# Altium footprint library CPU.PcbLib: 56 footprints (part 3 of 4)
Each footprint in its own frame and in the unit in brackets; x right, y up, seen from the top. Pads: shape width x height; smd on the part's side, far side on the other; paste and mask are expansions set on the pad; w line width, h text height; cw(c..) or ccw(c..) is an arc to the next point about the centre after c.
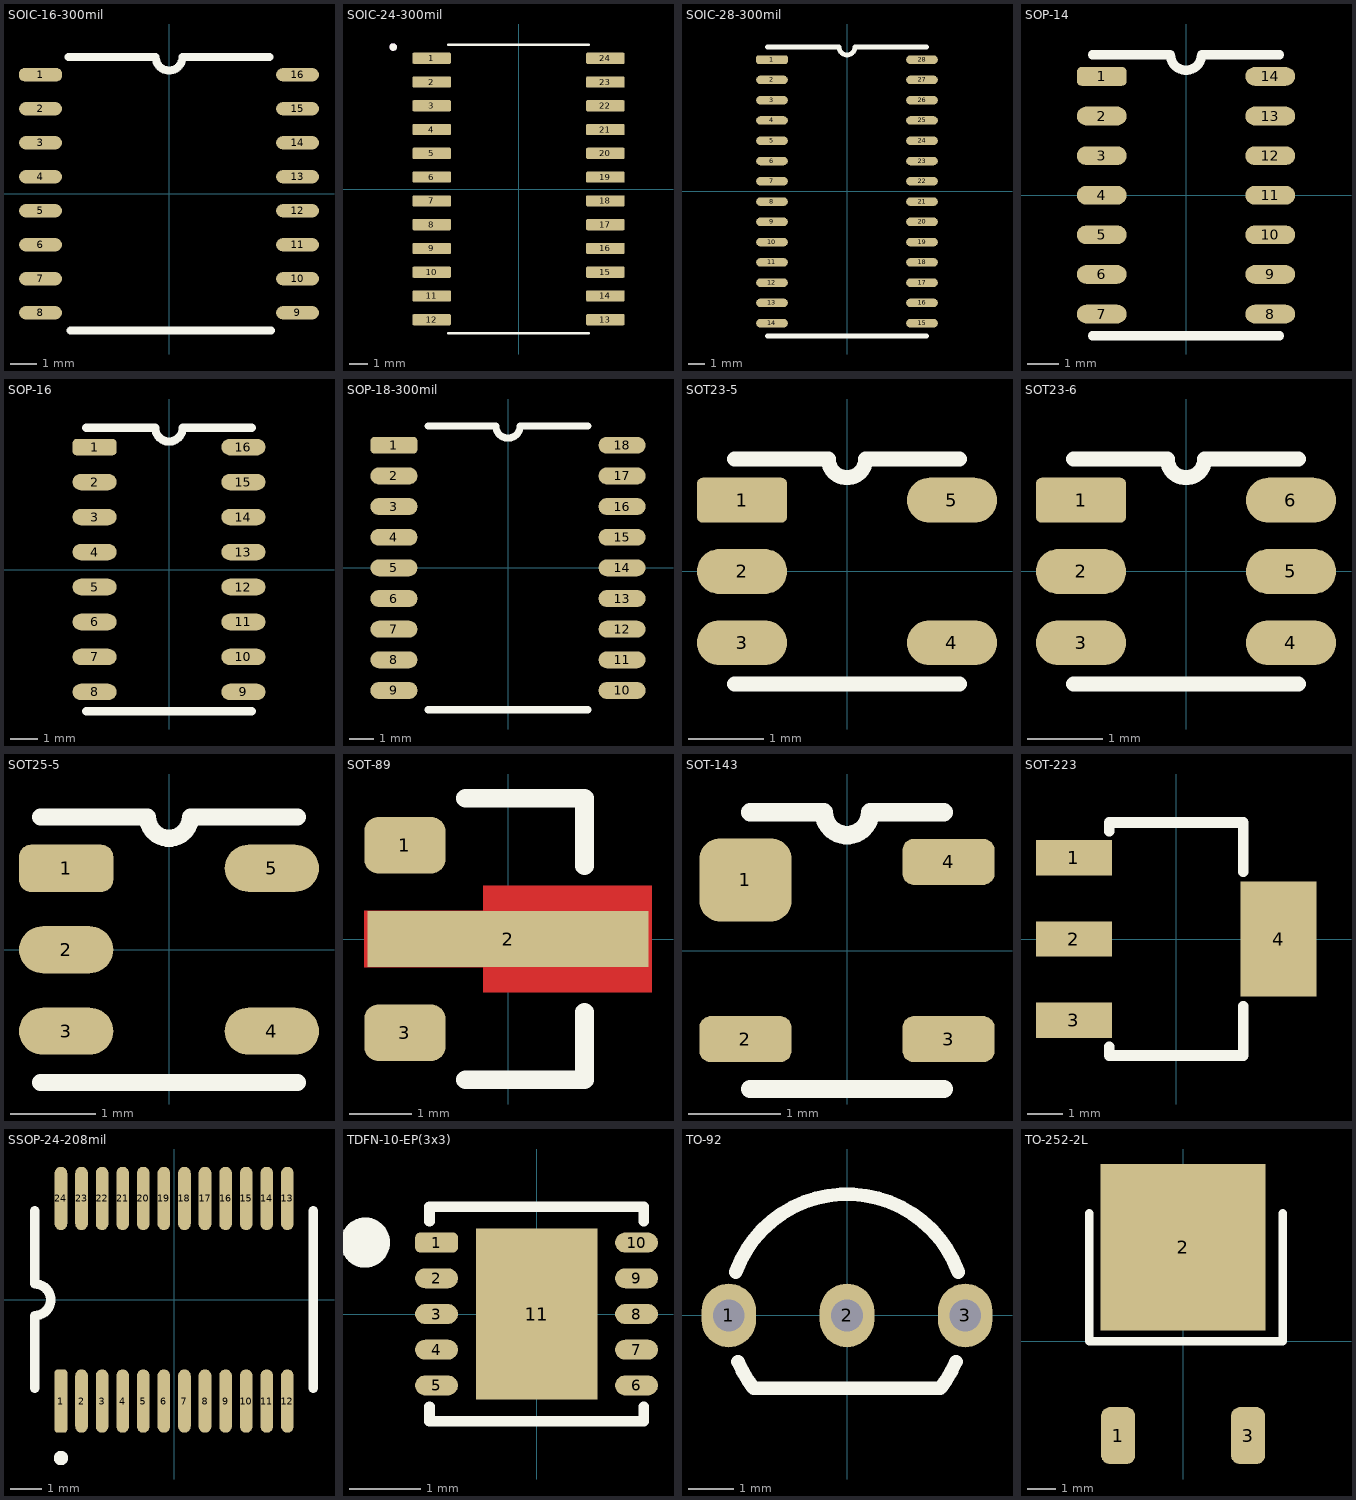
[diagram p2: the footprints below, top view; thin cyan lines are the x and y axes]

## SOIC-16-300mil [mm]
pads (16):
  rrect85% 1.61x0.5 smd: 1(-4.8,4.445)
  oval 1.6x0.5 smd: 2(-4.8,3.175) 3(-4.8,1.905) 4(-4.8,0.635) 5(-4.8,-0.635) 6(-4.8,-1.905) 7(-4.8,-3.175) 8(-4.8,-4.445) 9(4.8,-4.445) 10(4.8,-3.175) 11(4.8,-1.905) 12(4.8,-0.635) 13(4.8,0.635) 14(4.8,1.905) 15(4.8,3.175) 16(4.8,4.445)
Top Overlay:
  lines w0.3: -3.75,5.1 -0.5,5.1 ccw(c0,5.1) 0.5,5.1 3.75,5.1 ; -3.69,-5.1 3.81,-5.1
3D body "step_temp.STEP": height 2.65, standoff 0, extent -5.162,-5.15 5.162,5.15

## SOIC-24-300mil [mm]
pads (24):
  rrect25% 2.06x0.6 smd: 1(-4.64,6.985) 2(-4.64,5.715) 3(-4.64,4.445) 4(-4.64,3.175) 5(-4.64,1.905) 6(-4.64,0.635) 7(-4.64,-0.635) 8(-4.64,-1.905) 9(-4.64,-3.175) 10(-4.64,-4.445) 11(-4.64,-5.715) 12(-4.64,-6.985) 13(4.64,-6.985) 14(4.64,-5.715) 15(4.64,-4.445) 16(4.64,-3.175) 17(4.64,-1.905) 18(4.64,-0.635) 19(4.64,0.635) 20(4.64,1.905) 21(4.64,3.175) 22(4.64,4.445) 23(4.64,5.715) 24(4.64,6.985)
Top Overlay:
  circle w0.2: c-6.7,7.585 r0.1
  lines w0.127: -3.75,-7.7 3.75,-7.7 ; -3.75,7.7 3.75,7.7
3D:
  circle w0.2: c-6.7,7.585 r0.1

## SOIC-28-300mil [mil]
pads (28):
  rrect50% 78x21 smd: 1(-185,325)
  oval 78x21 smd: 2(-185,275) 3(-185,225) 4(-185,175) 5(-185,125) 6(-185,75) 7(-185,25) 8(-185,-25) 9(-185,-75) 10(-185,-125) 11(-185,-175) 12(-185,-225) 13(-185,-275) 14(-185,-325) 15(185,-325) 16(185,-275) 17(185,-225) 18(185,-175) 19(185,-125) 20(185,-75) 21(185,-25) 22(185,25) 23(185,75) 24(185,125) 25(185,175) 26(185,225) 27(185,275) 28(185,325)
Top Overlay:
  lines w11.81: -196.85,-356.3 196.85,-356.3 ; -196.85,356.3 -19.68,356.3 ccw(c0,356.3) 19.68,356.3 196.85,356.3
3D body "step_temp.STEP": height 104.33, standoff 0, extent -203.25,-352.36 203.25,352.36

## SOP-14 [mm]
pads (14):
  rrect50% 1.6x0.6 smd: 1(-2.7,3.81)
  oval 1.6x0.6 smd: 2(-2.7,2.54) 3(-2.7,1.27) 4(-2.7,0) 5(-2.7,-1.27) 6(-2.7,-2.54) 7(-2.7,-3.81) 8(2.7,-3.81) 9(2.7,-2.54) 10(2.7,-1.27) 11(2.7,0) 12(2.7,1.27) 13(2.7,2.54) 14(2.7,3.81)
Top Overlay:
  lines w0.3: -3,-4.51 3,-4.51 ; -3,4.51 -0.5,4.51 ccw(c0,4.51) 0.5,4.51 3,4.51
3D body "User Library-SOP14.STEP": height 1.39, standoff 0, extent -3.119,-4.375 3.119,4.375

## SOP-16 [mm]
pads (16):
  rrect50% 1.6x0.6 smd: 1(-2.7,4.445)
  oval 1.6x0.6 smd: 2(-2.7,3.175) 3(-2.7,1.905) 4(-2.7,0.635) 5(-2.7,-0.635) 6(-2.7,-1.905) 7(-2.7,-3.175) 8(-2.7,-4.445) 9(2.7,-4.445) 10(2.7,-3.175) 11(2.7,-1.905) 12(2.7,-0.635) 13(2.7,0.635) 14(2.7,1.905) 15(2.7,3.175) 16(2.7,4.445)
Top Overlay:
  lines w0.3: -3,-5.145 3,-5.145 ; -3,5.145 -0.5,5.145 ccw(c0,5.145) 0.5,5.145 3,5.145
3D body "pam8403dr.stp": height 1.63, standoff 0, extent -3.025,-5 3.025,4.9

## SOP-18-300mil [mm]
pads (18):
  rrect50% 1.95x0.7 smd: 1(-4.725,5.08)
  oval 1.95x0.7 smd: 2(-4.725,3.81) 3(-4.725,2.54) 4(-4.725,1.27) 5(-4.725,0) 6(-4.725,-1.27) 7(-4.725,-2.54) 8(-4.725,-3.81) 9(-4.725,-5.08) 10(4.725,-5.08) 11(4.725,-3.81) 12(4.725,-2.54) 13(4.725,-1.27) 14(4.725,0) 15(4.725,1.27) 16(4.725,2.54) 17(4.725,3.81) 18(4.725,5.08)
Top Overlay:
  lines w0.3: -3.3,-5.875 3.3,-5.875 ; -3.3,5.875 -0.5,5.875 ccw(c0,5.875) 0.5,5.875 3.3,5.875
3D body "DW0018A.stp": height 2.59, standoff 0, extent -5.167,-5.775 5.167,5.775

## SOT23-5 [mm]
pads (5):
  rrect25% 1.2x0.6 smd: 1(-1.4,0.95)
  oval 1.2x0.6 smd: 2(-1.4,0) 3(-1.4,-0.95) 4(1.4,-0.95) 5(1.4,0.95)
Top Overlay:
  lines w0.2: -1.5,-1.5 1.5,-1.5 ; -1.5,1.5 -0.25,1.5 ccw(c0,1.5) 0.25,1.5 1.5,1.5
3D body "step_temp.STEP": height 1.45, standoff 0, extent -1.4,-1.45 1.4,1.45

## SOT23-6 [mm]
pads (6):
  rrect25% 1.2x0.6 smd: 1(-1.4,0.95)
  oval 1.2x0.6 smd: 2(-1.4,0) 3(-1.4,-0.95) 4(1.4,-0.95) 5(1.4,0) 6(1.4,0.95)
Top Overlay:
  lines w0.2: -1.5,-1.5 1.5,-1.5 ; -1.5,1.5 -0.25,1.5 ccw(c0,1.5) 0.25,1.5 1.5,1.5
3D body "step_temp.STEP": height 1.45, standoff 0, extent -1.4,-1.45 1.4,1.45

## SOT25-5 [mm]
pads (5):
  rrect50% 1.1x0.55 smd: 1(-1.2,0.95)
  oval 1.1x0.55 smd: 2(-1.2,0) 3(-1.2,-0.95) 4(1.2,-0.95) 5(1.2,0.95)
Top Overlay:
  lines w0.2: -1.5,-1.55 1.5,-1.55 ; -1.5,1.55 -0.25,1.55 ccw(c0,1.55) 0.25,1.55 1.5,1.55
3D body "step_temp.STEP": height 1.4, standoff 0, extent -1.4,-1.5 1.4,1.5

## SOT-89 [mm]
height 1.6
pads (3):
  rrect50% 1.3x0.9 smd: 1(-1.65,1.5) 3(-1.65,-1.5)
  rect 4.5x0.9 smd paste-1 mask+0: 2(0,0)
Top Layer:
  region: 2.3,-0.85 -0.4,-0.85 -0.4,-0.45 -2.3,-0.45 -2.3,0.45 -0.4,0.45 -0.4,0.85 2.3,0.85
Top Overlay:
  lines w0.3: -0.68,-2.25 1.222,-2.25 1.222,-1.17 ; -0.68,2.25 1.222,2.25 1.222,1.17
Top Paste:
  region: 0.76,-0.47 -0.21,-0.47 -0.21,0.47 0.76,0.47
  region: 2.11,-0.47 1.14,-0.47 1.14,0.47 2.11,0.47
  region: -0.51,-0.235 -1.24,-0.235 -1.24,0.235 -0.51,0.235
  region: -1.46,-0.235 -2.19,-0.235 -2.19,0.235 -1.46,0.235
Top Solder:
  region: 2.4,-0.95 -0.5,-0.95 -0.5,-0.55 -2.4,-0.55 -2.4,0.55 -0.5,0.55 -0.5,0.95 2.4,0.95
3D body "SOT-89.step": height 1.35, standoff 0, extent -2.119,-2.3 2.131,2.3

## SOT-143 [mm]
pads (4):
  rrect50% 1x0.9 smd: 1(-1.1,0.765)
  rrect50% 1x0.5 smd: 2(-1.1,-0.96) 3(1.1,-0.96) 4(1.1,0.96)
Top Overlay:
  lines w0.2: -1.05,-1.5 1.05,-1.5 ; -1.05,1.5 -0.25,1.5 ccw(c0,1.5) 0.25,1.5 1.05,1.5
3D body "step_temp.STEP": height 1.22, standoff 0, extent -1.185,-1.46 1.185,1.46

## SOT-223 [mm]
pads (4):
  rect 2.15x1 smd: 1(-2.9,2.3) 2(-2.9,0) 3(-2.9,-2.3)
  rect 2.15x3.25 smd: 4(2.9,0)
Top Overlay:
  lines w0.3: -1.9,-3.048 -1.9,-3.3 1.9,-3.3 1.9,-1.9 ; -1.9,3.048 -1.9,3.3 1.9,3.3 1.9,1.9
3D body "step_temp.STEP": height 1.8, standoff 0, extent -3.499,-3.25 3.499,3.25

## SSOP-24-208mil [mm]
pads (24):
  rrect50% 0.4x2 smd: 1(-3.575,-3.2)
  oval 0.4x2 smd: 2(-2.925,-3.2) 3(-2.275,-3.2) 4(-1.625,-3.2) 5(-0.975,-3.2) 6(-0.325,-3.2) 7(0.325,-3.2) 8(0.975,-3.2) 9(1.625,-3.2) 10(2.275,-3.2) 11(2.925,-3.2) 12(3.575,-3.2) 13(3.575,3.2) 14(2.925,3.2) 15(2.275,3.2) 16(1.625,3.2) 17(0.975,3.2) 18(0.325,3.2) 19(-0.325,3.2) 20(-0.975,3.2) 21(-1.625,3.2) 22(-2.275,3.2) 23(-2.925,3.2) 24(-3.575,3.2)
Top Overlay:
  circle w0.254: c-3.575,-5 r0.1
  lines w0.3: -4.4,-2.795 -4.4,-0.5 ccw(c-4.4,0) -4.4,0.5 -4.4,2.805 ; 4.4,-2.795 4.4,2.805
3D body "SSOP24L-150-0.64.STEP": height 1.63, standoff 0, extent -4.36,-2.997 4.36,2.997

## TDFN-10-EP(3x3) [mm]
pads (11):
  rrect50% 0.6x0.28 smd: 1(-1.4,1)
  oval 0.6x0.28 smd: 2(-1.4,0.5) 3(-1.4,0) 4(-1.4,-0.5) 5(-1.4,-1) 6(1.4,-1) 7(1.4,-0.5) 8(1.4,0) 9(1.4,0.5) 10(1.4,1)
  rect 1.7x2.4 smd: 11(0,0)
Top Overlay:
  circle w0.5: c-2.4,1 r0.1
  lines w0.15: -1.5,-1.3 -1.5,-1.5 1.5,-1.5 1.5,-1.3 ; -1.5,1.3 -1.5,1.5 1.5,1.5 1.5,1.3
3D body "TDFN50P-3MMX3MM-10 v0.step": height 0.86, standoff 0.1, extent -1.51,-1.5 1.51,1.5

## TO-92 [mm]
pads (3):
  oval 1.2x1.4 hole 0.7: 1(-2.6,0) 2(0,0) 3(2.6,0)
Top Overlay:
  lines w0.3: -2.448,0.956 cw(c0,0.065) 2.448,0.956 ; -2.398,-1.018 ccw(c0,0) -2.053,-1.604 2.053,-1.604 ccw(c0,0) 2.398,-1.018
3D body "TO-92_line_pin_2_5mm_pitch.stp": height 8.2, standoff -3, extent -2.75,-1.85 2.75,2.512

## TO-252-2L [mm]
pads (3):
  rrect50% 1.2x2 smd mask+0.15: 1(-2.285,-3.313) 3(2.285,-3.313)
  rect 5.8x5.85 smd: 2(0,3.313)
Top Overlay:
  lines w0.3: -3.3,4.5 -3.3,0 3.5,0 3.5,4.5
3D body "TO-252-2L.STEP": height 2.29, standoff 0, extent -3.29,-3.99 3.29,5.95